# Altium schematic symbol library lib_datalogger.SchLib: 1246 symbols (part 1 of 16)
Pins are listed as number, name and electrical type; pins without a type are passive.

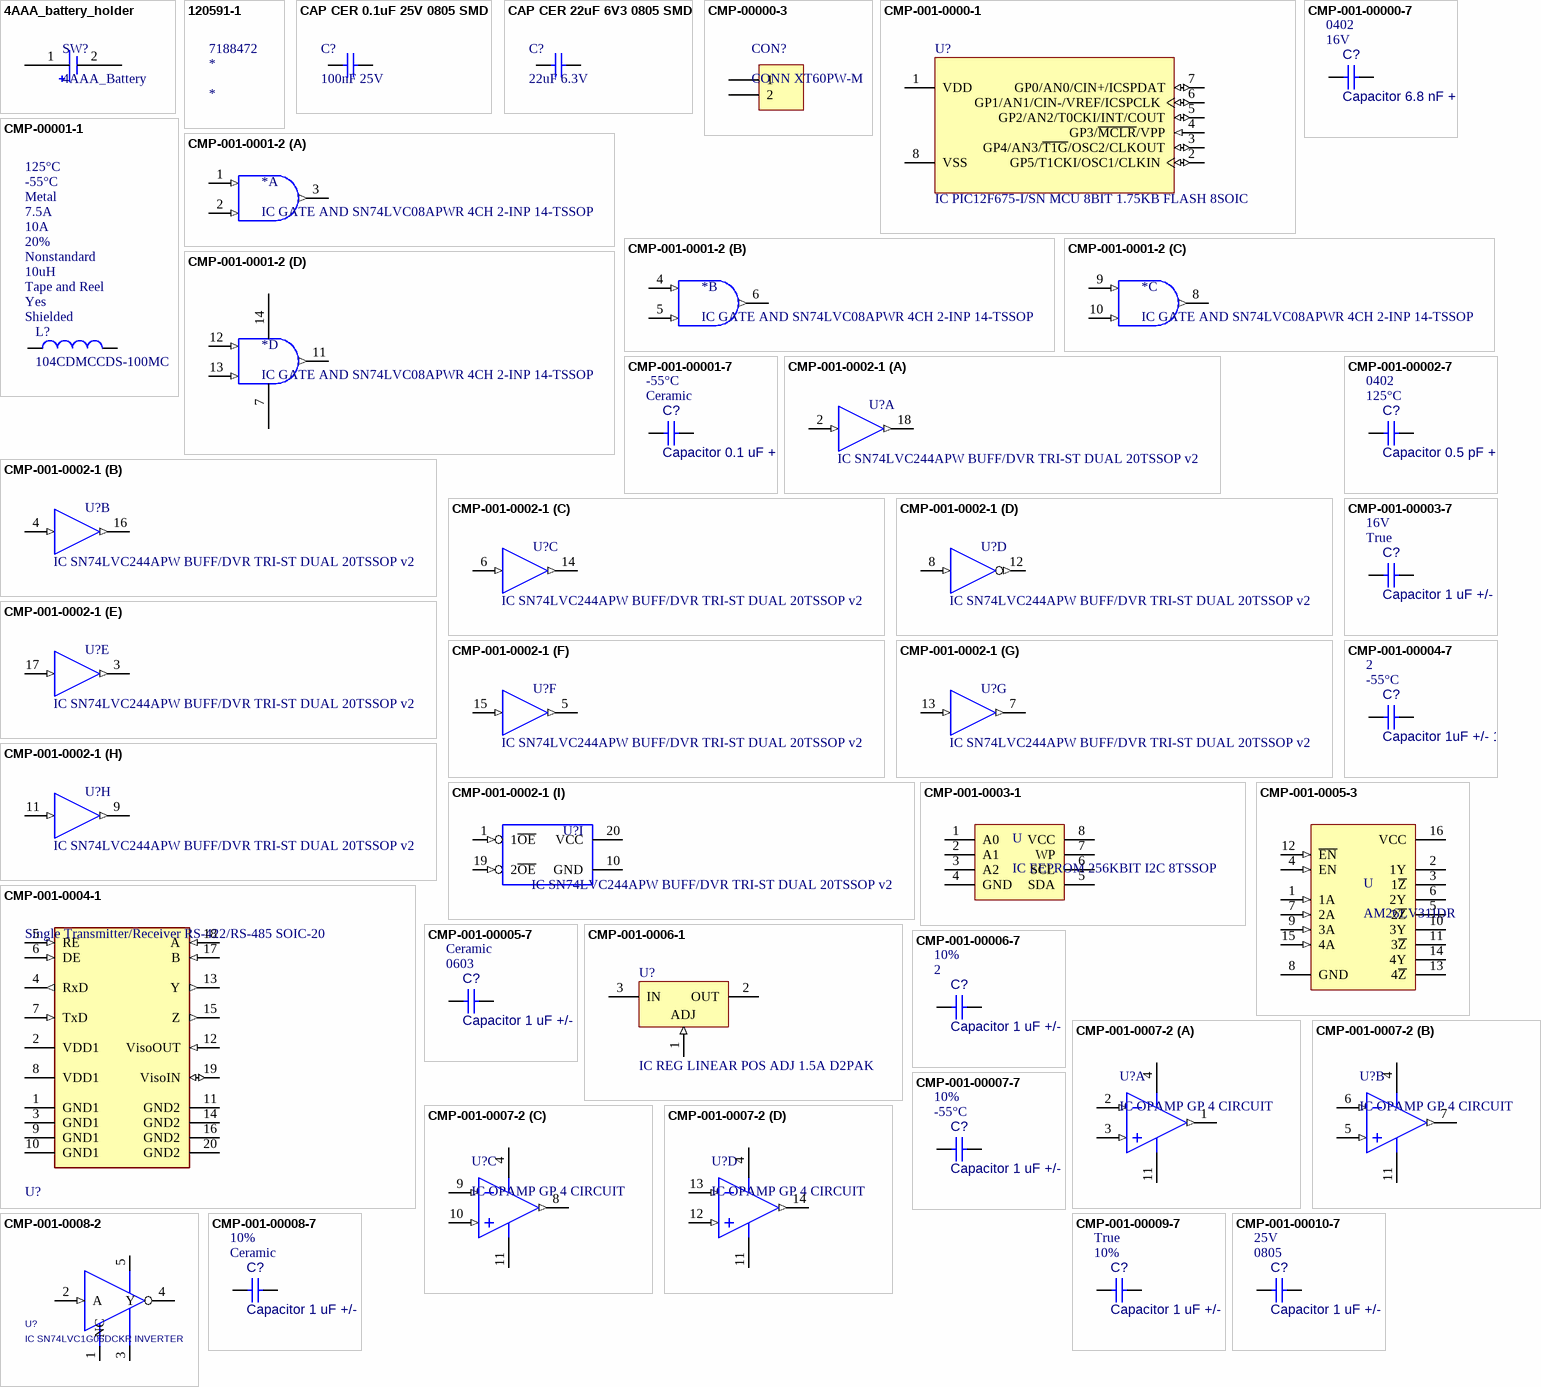
[diagram p0: symbols 4AAA_battery_holder to CMP-001-00010-7]

## 4AAA_battery_holder
designator SW?, comment 4AAA_Battery
Enclosure; Accessory; Battery Holder; Polypropylene; 26ga. 6in Leads; 4-AA; Manufacturer: Bud Industries; Manufacturer Part Number: HH-3633; Number of Cells: 4; Supplier 1: Newark; RoHS: Yes; Category: Batteries and Accessories; Stock 1: 555; Pricing 1: 1=3,20000, 10=3,07000, 25=2,94000, 50=2,80000, 100=2,67000, 250=2,40000 (USD); Mount: Chassis; Material: PP,Polypropylene; Body Material: Polypropylene; Weight: 0.43oz; Color: Black; Package Quantity: 1; Termination: Wire Leads; Number of Batteries: 4; REACH SVHC: Unknown; Lead Free: Lead Free; ComponentLink1URL: https://datasheet.ciiva.com/4628/hb3633-36618-4628665.pdf?src-supplier=Mouser; ComponentLink1Description: https://datasheet.ciiva.com/4628/hb3633-36618-4628665.pdf?src-supplier=Mouser; ComponentLink2URL: https://datasheet.ciiva.com/16495/hb3633-16495410.pdf?src-supplier=Future+Electronics; ComponentLink2Description: https://datasheet.ciiva.com/16495/hb3633-16495410.pdf?src-supplier=Future+Electronics; ComponentLink3URL: https://datasheet.ciiva.com/1438/1807993-1438161.pdf?src-supplier=Newark; ComponentLink3Description: https://datasheet.ciiva.com/1438/1807993-1438161.pdf?src-supplier=Newark; Supplier Part Number 1: 34M2187
footprint 4AAA_BATTERY_HOLDER
pins: 1, 2

## 120591-1
designator *  Supplier Part Number 1: 7188472
Connector Accessories Battery Holder Socket 2 POS Polybutylene Terephthalate Tray; Manufacturer: TE Connectivity; Manufacturer Part Number: 120591-1; Manufacturer Series: 120591; Number of Terminals/Pins: 3; Number of Cells: 1; Max Voltage Rating (AC): 30V; Number of Contacts: 2; PCB Mount Retention: Without; Circuit Application: Signal; Connector System: Board-to-Board; Contact Current Rating: 7A; Gender: Female; Option: General Purpose; Filter Feature: No; Pitch: 2.54mm; Supplier 1: RSComponents; RoHS: Yes; Category: Power Connectors; Stock 1: 1; Pricing 1: 1=2,79700, 25=2,30000, 100=2,16500, 500=1,82900, 1000=1,56000 (USD); Mount: Through Hole,PCB,Board; Number of Pins: 3; Material: Bronze; Contact Plating: Tin; Color: Black; Contact Material: Bronze; Housing Color: Black; Housing Material: PBT; Contact Finish - Mating: TIN; Contact Finish - Termination: TIN; Min Operating Temperature: -30°C; Max Operating Temperature: 70°C; Package Quantity: 144; Packaging: Tray; Termination: Solder; Number of Ports: 1; Orientation: Right Angle; Number of Positions: 2; Voltage Rating: 30V; Contact Gender: Female; Mounting Style: HORIZONTAL; Mixed Contacts: No; Length: 27.3mm; Depth: 19.05mm; Radiation Hardening: No; Lead Free: Lead Free; RoHS Compliant: Yes; ELV: Compliant; Flammability Rating: UL94 V-0; DIN Conformance: No; IEC Conformance: No; MIL Conformance: No; ComponentLink1URL: https://datasheet.ciiva.com/3/eng-cd-120591-h-3795.pdf?src-supplier=Digi-Key; ComponentLink1Description: https://datasheet.ciiva.com/3/eng-cd-120591-h-3795.pdf?src-supplier=Digi-Key; ComponentLink2URL: https://datasheet.ciiva.com/19463/748422-19463210.pdf?src-supplier=Jameco; ComponentLink2Description: https://datasheet.ciiva.com/19463/748422-19463210.pdf?src-supplier=Jameco; ComponentLink3URL: https://datasheet.ciiva.com/1437/1651039-1437553.pdf?src-supplier=Newark; ComponentLink3Description: https://datasheet.ciiva.com/1437/1651039-1437553.pdf?src-supplier=Newark; ComponentLink4URL: https://datasheet.ciiva.com/11746/0900766b80f810d3-11746392.pdf?src-supplier=RSComponents; ComponentLink4Description: https://datasheet.ciiva.com/11746/0900766b80f810d3-11746392.pdf?src-supplier=RSComponents; ComponentLink5URL: https://datasheet.ciiva.com/14643/70087950-14643845.pdf?src-supplier=Allied+Electronics; ComponentLink5Description: https://datasheet.ciiva.com/14643/70087950-14643845.pdf?src-supplier=Allied+Electronics; ComponentLink6URL: https://datasheet.ciiva.com/3126/eng-cs-1773096-sec09-laptops-portables-0210-3126570.pdf?src-supplier=Avnet; ComponentLink6Description: https://datasheet.ciiva.com/3126/eng-cs-1773096-sec09-laptops-portables-0210-3126570.pdf?src-supplier=Avnet

## CAP CER 0.1uF 25V 0805 SMD
designator C?, comment 100nF 25V
Cap Ceramic 0.1uF 25V X7R 10% SMD 0805 125C Plastic T/R; Manufacturer: KEMET; Manufacturer Part Number: C0805C104K3RACTU; Supplier 1: RSComponents; RoHS: Yes; Category: Ceramic Capacitors; Stock 1: 1910; Pricing 1: 10=0,13300, 100=0,12200, 250=0,11000, 500=0,09400, 1000=0,08300 (USD); Mount: PCB,Surface Mount; Case/Package: 0805; Case Code (Imperial): 0805; Case Code (Metric): 2012; Dielectric Material: Ceramic; Contact Plating: Tin,Matte; Min Operating Temperature: -55°C; Max Operating Temperature: 125°C; Packaging: Tape and Reel; Tolerance: 10%; Capacitance: 100nF; Package Quantity: 4000; Voltage Rating: 25V; Series: C0805C; Voltage Rating (DC): 25V; Dielectric: X7R; Termination: SMD/SMT; Construction: Flat; Voltage: 25V; Length: 2mm; Width: 1.2mm; Height: 0.9mm; Depth: 1.25mm; Lead Pitch: 0.75mm; Radiation Hardening: No; RoHS Compliant: Yes; ComponentLink1URL: https://datasheet.ciiva.com/18193/getdatasheetpartid-385649-18193413.pdf?src-supplier=Verical; ComponentLink1Description: https://datasheet.ciiva.com/18193/getdatasheetpartid-385649-18193413.pdf?src-supplier=Verical; ComponentLink2URL: https://datasheet.ciiva.com/7842/kem-c1002-x7r-smd-7842536.pdf?src-supplier=Element14; ComponentLink2Description: https://datasheet.ciiva.com/7842/kem-c1002-x7r-smd-7842536.pdf?src-supplier=Element14; ComponentLink3URL: https://datasheet.ciiva.com/7842/kem-c1002-x7r-smd-7842538.pdf?src-supplier=Element14; ComponentLink3Description: https://datasheet.ciiva.com/7842/kem-c1002-x7r-smd-7842538.pdf?src-supplier=Element14; Supplier Part Number 1: 6480979
footprint CC2012-0805 (Chip Capacitor)
pins: 1, 2

## CAP CER 22uF 6V3 0805 SMD
designator C?, comment 22uF 6.3V
CAP CER 22UF 6.3V X5R 0805; Manufacturer: Samsung; Manufacturer Part Number: CL21A226KQQNNNE; Tolerance: 10%; Supplier 1: Avnet; RoHS: Yes; Category: Ceramic Capacitors; Stock 1: 46000; Pricing 1: 2000=0,02660, 4000=0,02622, 8000=0,02546, 12000=0,02489, 16000=0,02394 (USD); Mount: Surface Mount; Case/Package: 0805; Case Code (Metric): 2012; Case Code (Imperial): 0805; Min Operating Temperature: -55°C; Max Operating Temperature: 85°C; Package Quantity: 1; Packaging: Tape and Reel; Capacitance: 22uF; Voltage Rating: 6.3V; Voltage Rating (DC): 6.3V; Dielectric: X5R; Series: CL; Length: 0.079inch; Width: 0.049inch; Thickness: 0.055inch; Depth: 1.25mm; Radiation Hardening: No; RoHS Compliant: Yes; Lead Free: Lead Free; ComponentLink1URL: https://datasheet.ciiva.com/25796/cl21a226kqqnnne-25796131.pdf?src-supplier=Digi-Key; ComponentLink1Description: https://datasheet.ciiva.com/25796/cl21a226kqqnnne-25796131.pdf?src-supplier=Digi-Key; ComponentLink2URL: https://datasheet.ciiva.com/26838/getdatasheetpartid-353272-26838608.pdf?src-supplier=Verical; ComponentLink2Description: https://datasheet.ciiva.com/26838/getdatasheetpartid-353272-26838608.pdf?src-supplier=Verical; Supplier Part Number 1: CL21A226KQQNNNE
footprint CC2012-0805 (Chip Capacitor)
pins: 1, 2

## CMP-00000-3
designator CON?, comment CONN XT60PW-M
XT60PW Male, yellow; Manufacturer 1: AMASS; Voltage: 500V; current: 30A; Supplier 1: Eletronic Components; Supplier Part Number 1: XT60PW-M; Manufacturer Part Number 1: XT60PW-M; Supplier Unit Price 1: 0,90
footprint CONN XT30PW-M-Footprint-1
pins: 1, 2

## CMP-001-0000-1
designator U?, comment IC PIC12F675-I/SN MCU 8BIT 1.75KB FLASH 8SOIC
MCU 8-bit PIC RISC 1.75KB Flash 2.5V/3.3V/5V Automotive 8-Pin SOIC N Tube; Max Power Dissipation: 800mW; Number of A/D Converters: 1; Number of ADC Channels: 4; Number of I/Os: 6; Oscillator Type: Internal; Min Supply Voltage: 2V; Watchdog Timer: Yes; Access Time: 20us; Interface: RS-232,USB; Address Bus Width: 8b; Supply Current: 100uA; Max Frequency: 20MHz; RAM Size: 64B; Number of Bits: 8; Number of Timers/Counters: 2; Peripherals: POR,WDT; Max Supply Voltage: 5.5V; Lead Free: Lead Free; Packaging: Rail/Tube; Core Architecture: PIC; Mount: Surface Mount; Min Operating Temperature: -40°C; Max Operating Temperature: 85°C; Density: 1.75KB; Memory Size: 1.75KB; Package Quantity: 100; Length: 4.9mm; Number of Pins: 8; Manufacturer Part Number: PIC12F675-I/SN; Radiation Hardening: No; Case/Package: SOIC; Height: 1.5mm; REACH SVHC: No SVHC; Data Bus Width: 8b; Memory Type: FLASH; Width: 3.9mm; Number of Programmable I/O: 6; Frequency: 20MHz; RoHS Compliant: Yes; Nominal Supply Current: 100uA
footprint SOIC-8
pins: 1 VDD (power), 2 GP5/T1CKI/OSC1/CLKIN (io), 3 GP4/AN3/~{T1G}/OSC2/CLKOUT (io), 4 GP3/~{MCLR}/VPP (in), 5 GP2/AN2/T0CKI/INT/COUT (io), 6 GP1/AN1/CIN-/VREF/ICSPCLK (io), 7 GP0/AN0/CIN+/ICSPDAT (io), 8 VSS (power)

## CMP-001-00000-7
designator C?, comment Capacitor 6.8 nF +/- 10% 16 V 0402  value 6.8nF  Voltage Rating: 16V  Case/Package: 0402  Pins: 2  Max Operating Temperature: 125°C  Capacitor Type: Ceramic  Mounting Technology: SM  Tolerance: 10%  RoHS Compliant: True  Min Operating Temperature: -55°C
Chip Capacitor, 6.8 nF, +/- 10%, 16 V, 0402 (1005 Metric)
footprint CAPC0603(1608)100_L (Chip Capacitor, Body 1.6x0.8mm, Height 1.0mm, IPC High Density)
footprint CAPC1005X56X25ML10T15 (Chip Capacitor, 2-Leads, Body 1.10x0.60mm, IPC Low Density)
footprint CAPC1005X56X25LL10T15 (Chip Capacitor, 2-Leads, Body 1.10x0.60mm, IPC High Density)
footprint CAPC1005X56X25NL10T15 (Chip Capacitor, 2-Leads, Body 1.10x0.60mm, IPC Medium Density)
pins: 1, 2

## CMP-00001-1
designator L?, comment 104CDMCCDS-100MC  Shielding: Shielded  RoHS Compliant: Yes  Packaging: Tape and Reel  Inductance: 10uH  Case/Package: Nonstandard  Tolerance: 20%  Saturation Current: 10A  Current Rating: 7.5A  Core Material: Metal  Min Operating Temperature: -55°C  Max Operating Temperature: 125°C
Ind Chip Power Metal Compound 10uH 20% 2-Pin SMD T/R; Test Frequency: 100kHz; DC Resistance (DCR): 30mR; Width: 0.394inch; Height - Seated (Max): 0.157inch; Mount: Surface Mount; Length: 0.453inch
footprint 104CDMCCDS100MC
pins: 1, 2

## CMP-001-0001-2
designator *, comment IC GATE AND SN74LVC08APWR 4CH 2-INP 14-TSSOP
IC GATE AND SN74LVC08APWR 4CH 2-INP 14-TSSOP, 1.65-V to 3.6-V AND gates -40 to 125; Max Output Current: 24mA; Number of Circuits: 4; Schmitt Trigger Input: No; Min Supply Voltage: 1.65V; Turn-On Delay Time: 4.1ns; Quiescent Current: 1uA; Number of Inputs: 2; Number of Outputs: 1; High Level Output Current: -24mA; Propagation Delay: 3.9ns; Max Supply Voltage: 3.6V; Manufacturer Part Number: SN74LVC08APWR; Height: 1.15mm; Radiation Hardening: No; Low Level Output Current: 24mA; Output Current: 24mA; Case/Package: TSSOP; Max Operating Temperature: 125°C; Length: 5mm; Termination: SMD/SMT; Min Operating Temperature: -40°C; REACH SVHC: No SVHC; Number of Gates: 4; Number of Elements: 4; Weight: 0.002018oz; Number of Pins: 14; Logic Function: AND GATE; Packaging: Tape and Reel; Mount: Surface Mount; Lead Free: Lead Free; RoHS Compliant: Yes; Number of Input Lines: 2; Number of Output Lines: 1; Package Quantity: 1; Width: 4.4mm; Number of Bits: 4
footprint MCHP-TSSOP-ST14_V (TSSOP, 14-Leads, Body 5.1x4.5mm, Pitch 0.65mm)
part A pins: 1 A (in), 2 B (in), 3 Y (out)
part B pins: 4 A (in), 5 B (in), 6 Y (out)
part C pins: 8 Y (out), 9 A (in), 10 B (in)
part D pins: 7 GND, 11 Y (out), 12 A (in), 13 B (in), 14 VCC

## CMP-001-00001-7
designator C?, comment Capacitor 0.1 uF +/- 5% 16 V 0402  value 100nF  Capacitor Type: Ceramic  Min Operating Temperature: -55°C  RoHS Compliant: True  Max Operating Temperature: 125°C  Voltage Rating: 16V  Pins: 2  Tolerance: 5%  Mounting Technology: SM  Case/Package: 0402
Chip Capacitor, 0.1 uF, +/- 5%, 16 V, 0402 (1005 Metric)
footprint CAPC0603(1608)100_L (Chip Capacitor, Body 1.6x0.8mm, Height 1.0mm, IPC High Density)
footprint CAPC1005X56X25ML10T15 (Chip Capacitor, 2-Leads, Body 1.10x0.60mm, IPC Low Density)
footprint CAPC1005X56X25LL10T15 (Chip Capacitor, 2-Leads, Body 1.10x0.60mm, IPC High Density)
footprint CAPC1005X56X25NL10T15 (Chip Capacitor, 2-Leads, Body 1.10x0.60mm, IPC Medium Density)
pins: 1, 2

## CMP-001-0002-1
designator U?, comment IC SN74LVC244APW BUFF/DVR TRI-ST DUAL 20TSSOP v2
IC BUFF/DVR TRI-ST DUAL 20TSSOP; Manufacturer Part Number: SN74LVC244APWR; Fornecedor - Sugerido: Digikey; Fabricante - Sugerido: Texas Instruments; Logic Type: Buffer, Non-Inverting; Voltage - Supply: 1.65 V ~ 3.6 V; Current - Output High, Low: 24mA, 24mA; Number of Bits per Element: 4; Number of Elements: 2; Output Type: Push-Pull; PartNumber: SN74LVC244APW; Observação: --; Supplier Device Package: 20-TSSOP; Input Type: -; Operating Temperature: -40°C ~ 125°C (TA); Pricing 1: 1=0.45, 10=0.387, 100=0.289, 500=0.227, 1000=0.175 (USD); ComponentLink1Description: http://www.ti.com/lit/ds/symlink/sn74lvc244a.pdf; Manufacturer: Texas Instruments; Stock 1: 33691; Package / Case: 20-TSSOP (0.173", 4.40mm Width); Category: Integrated Circuits (ICs); Mounting Type: Surface Mount; Part Status: Active; ComponentLink1URL: http://www.ti.com/lit/ds/symlink/sn74lvc244a.pdf; Packaging: Cut Tape (CT); Design Item ID: IC SN74LVC244APW BUFF/DVR TRI-ST DUAL 20TSSOP; Source: mits.SchLib; RoHS: RoHS Compliant
footprint TSSOP20
footprint TSSOP20 - duplicate
footprint 20-TSSOP
part A pins: 2 1A0 (in), 18 1Y0 (out)
part B pins: 4 1A1 (in), 16 1Y1 (out)
part C pins: 6 1A2 (in), 14 1Y2 (out)
part D pins: 8 1A3 (in), 12 1Y3 (out)
part E pins: 3 2Y0 (out), 17 2A0 (in)
part F pins: 5 2Y1 (out), 15 2A1 (in)
part G pins: 7 2Y2 (out), 13 2A2 (in)
part H pins: 9 2Y3 (out), 11 2A3 (in)
part I pins: 1 1~{OE} (in), 10 GND (power), 19 2~{OE} (in), 20 VCC (power)

## CMP-001-00002-7
designator C?, comment Capacitor 0.5 pF +/- 0.1pF 25 V 0402  value 0.5pF  Max Operating Temperature: 125°C  Case/Package: 0402  Mounting Technology: SM  Pins: 2  Min Operating Temperature: -55°C  RoHS Compliant: True  Voltage Rating: 25V  Tolerance: 20%  Capacitor Type: Ceramic
Chip Capacitor, 0.5 pF, +/- 0.1pF, 25 V, 0402 (1005 Metric)
footprint CAPC0603(1608)100_L (Chip Capacitor, Body 1.6x0.8mm, Height 1.0mm, IPC High Density)
footprint CAPC1005X56X25ML10T15 (Chip Capacitor, 2-Leads, Body 1.10x0.60mm, IPC Low Density)
footprint CAPC1005X56X25LL10T15 (Chip Capacitor, 2-Leads, Body 1.10x0.60mm, IPC High Density)
footprint CAPC1005X56X25NL10T15 (Chip Capacitor, 2-Leads, Body 1.10x0.60mm, IPC Medium Density)
pins: 1, 2

## CMP-001-0003-1
designator U, comment IC EEPROM 256KBIT I2C 8TSSOP
EEPROM Memory IC 256Kb (32K x 8) I²C 8-TSSOP; Manufacturer Part Number: 24LC256-I/ST; Min Supply Voltage: 2.5V; Programming Voltage: 5.5V; Interface: I2C,Serial,2-Wire; Write Cycle Time-Max (tWC): 5ms; Organization: 32KX8; Write Protection: YES; Supply Current: 3mA; Access Time-Max: 900ns; Frequency: 400kHz; Case/Package: TSSOP; Package Quantity: 100; Contact Plating: Tin,Matte; Radiation Hardening: No; Lead Free: Lead Free; Mount: Surface Mount; Number of Pins: 8; Length: 3.1mm; Max Operating Temperature: 85°C; Memory Size: 256Kb; Supply Voltage-Nom: 5.5V; Height: 1.05mm; Width: 4.5mm; Memory Type: EEPROM; REACH SVHC: No SVHC; Nominal Supply Current: 3mA; Packaging: Rail/Tube; Min Operating Temperature: -40°C; Density: 256Kb; Max Frequency: 400kHz; RoHS Compliant: Yes; Access Time: 900ns; Max Supply Voltage: 5.5V
footprint TSSOP8
pins: 1 A0 "DEVICE ADDRES 0", 2 A1 "DEVICE ADDRES 1", 3 A2 "DEVICE ADDRES 2", 4 GND "GROUND", 5 SDA "I2C DATA", 6 SCL "I2C DATA CLOCK", 7 WP "WRITE PROTECTION", 8 VCC "3.3V VOLTAGE SUPLY"

## CMP-001-00003-7
designator C?, comment Capacitor 1 uF +/- 10% 16 V 0603  value 1µF  RoHS Compliant: True  Voltage Rating: 16V  Min Operating Temperature: -55°C  Max Operating Temperature: 125°C  Mounting Technology: SM  Capacitor Type: Ceramic  Pins: 2  Tolerance: 10%  Case/Package: 0603
Chip Capacitor, 1 uF, +/- 10%, 16 V, 0603 (1608 Metric)
footprint CAPC0603(1608)100_L (Chip Capacitor, Body 1.6x0.8mm, Height 1.0mm, IPC High Density)
footprint CAPC1608X94X35NL15T15 (Chip Capacitor, 2-Leads, Body 1.75x0.96mm, IPC Medium Density)
footprint CAPC1608X94X35LL15T15 (Chip Capacitor, 2-Leads, Body 1.75x0.96mm, IPC High Density)
footprint CAPC1608X94X35ML15T15 (Chip Capacitor, 2-Leads, Body 1.75x0.96mm, IPC Low Density)
pins: 1, 2

## CMP-001-0004-1
designator U?, comment Single Transmitter/Receiver RS-422/RS-485 SOIC-20
Single Transmitter/Receiver RS-422/RS-485 20-Pin SOIC W Tube; Manufacturer Part Number: ADM2582EBRWZ; Operating Supply Voltage: 5V; Number of Channels: 3; Propagation Delay: 100ns; Number of Receivers: 1; Logic Function: Transceiver; Max Supply Voltage: 5.5V; Operating Supply Current: 230mA; Min Supply Voltage: 3V; Channel Type: Unidirectional; Isolation Voltage: 2.5kV; Data Rate: 16Mbps; ESD Protection: Yes; Simplex/Duplex: Full Duplex; Interface: RS-485,RS-422; Frequency: 16MHz; Height: 2.35mm; Width: 7.6mm; Lead Free: Contains Lead; Package Quantity: 37; RoHS Compliant: Yes; Min Operating Temperature: -40°C; Packaging: Rail/Tube; Number of Pins: 20; Number of Drivers: 1; Number of Transmitters: 1; Number of Transceivers: 1; Length: 13mm; REACH SVHC: No SVHC; Mount: Surface Mount; Case/Package: SOIC; Contact Plating: Tin,Matte; Max Operating Temperature: 85°C; Nominal Supply Current: 230mA; Isolated Power: Yes
footprint STM-SOIC-20_M (SOIC, 20-Leads, Body 13x7.6mm, Pitch 1.27mm, IPC Low Density)
pins: 1 GND1 (power), 2 VDD1 (power), 3 GND1 (power), 4 RxD (out), 5 RE (in), 6 DE (in), 7 TxD (in), 8 VDD1 (power), 9 GND1 (power), 10 GND1 (power), 11 GND2 (power), 12 VisoOUT (in), 13 Y (out), 14 GND2 (power), 15 Z (out), 16 GND2 (power), 17 B (in), 18 A (in), 19 VisoIN (io), 20 GND2 (power)

## CMP-001-00004-7
designator C?, comment Capacitor 1uF +/- 10% 16V 0603  value 1µF  Min Operating Temperature: -55°C  Pins: 2  Tolerance: 10%  Mounting Technology: SM  Max Operating Temperature: 125°C  RoHS Compliant: True  Case/Package: 0603  Capacitor Type: Ceramic  Voltage Rating: 16V
Chip Capacitor, 1 uF, +/- 10%, 16 V, 0603 (1608 Metric)
footprint CAPC0603(1608)100_L (Chip Capacitor, Body 1.6x0.8mm, Height 1.0mm, IPC High Density)
footprint CAPC1608X90X35ML15T15 (Chip Capacitor, 2-Leads, Body 1.75x0.95mm, IPC Low Density)
footprint CAPC1608X90X35NL15T15 (Chip Capacitor, 2-Leads, Body 1.75x0.95mm, IPC Medium Density)
footprint CAPC1608X90X35LL15T15 (Chip Capacitor, 2-Leads, Body 1.75x0.95mm, IPC High Density)
pins: 1, 2

## CMP-001-0005-3
designator U, comment AM26LV31IDR
Low-Voltage High-Speed Quadruple Differential Line Driver 16-SOIC -45 to 85; Max Supply Current: 100uA; Interface: RS-422; Data Rate: 10Mbps; Min Supply Voltage: 3V; ESD Protection: No; Operating Supply Current: 17mA; Number of Receivers: 4; Logic Function: Receiver; Operating Supply Voltage: 3.3V; Max Supply Voltage: 3.6V; RoHS Compliant: Yes; Case/Package: SOIC; Lead Free: Lead Free; Max Operating Temperature: 85°C; Weight: 0.004998oz; Nominal Supply Current: 100uA; Supply Current: 100uA; Contact Plating: Gold; REACH SVHC: No SVHC; Number of Transmitters: 4; Radiation Hardening: No; Packaging: Tape and Reel; Package Quantity: 1; Number of Pins: 16; Number of Drivers: 4; Mount: Surface Mount; Min Operating Temperature: -45°C; Manufacturer Part Number: AM26LV31IDR; Series: -
footprint MAXM-S16+5_M (SOIC, 16-Leads, Body 10x4mm, Pitch 1.27mm, IPC Low Density)
pins: 1 1A (in), 2 1Y (hiz), 3 1~{Z} (hiz), 4 EN (in), 5 2~{Z} (hiz), 6 2Y (hiz), 7 2A (in), 8 GND (power), 9 3A (in), 10 3Y (hiz), 11 3~{Z} (hiz), 12 ~{EN} (in), 13 4~{Z} (hiz), 14 4Y (hiz), 15 4A (in), 16 VCC (power)

## CMP-001-00005-7
designator C?, comment Capacitor 1 uF +/- 10% 25 V 0603  value 1µF  Case/Package: 0603  Capacitor Type: Ceramic  Voltage Rating: 25V  RoHS Compliant: True  Min Operating Temperature: -55°C  Tolerance: 10%  Pins: 2  Max Operating Temperature: 125°C  Mounting Technology: SM
Chip Capacitor, 1 uF, +/- 10%, 25 V, 0603 (1608 Metric)
footprint CAPC0603(1608)100_L (Chip Capacitor, Body 1.6x0.8mm, Height 1.0mm, IPC High Density)
footprint CAPC1608X90X40ML10T20 (Chip Capacitor, 2-Leads, Body 1.70x0.90mm, IPC Low Density)
footprint CAPC1608X90X40NL10T20 (Chip Capacitor, 2-Leads, Body 1.70x0.90mm, IPC Medium Density)
footprint CAPC1608X90X40LL10T20 (Chip Capacitor, 2-Leads, Body 1.70x0.90mm, IPC High Density)
pins: 1, 2

## CMP-001-0006-1
designator U?, comment IC REG LINEAR POS ADJ 1.5A D2PAK
Linear Voltage Regulator IC 1.5A 1.2V to 37V D2PAK; Manufacturer Part Number: LM317D2T-TR; Max Input Voltage: 40V; Power Supply Rejection Ratio (PSRR): 80dB; Polarity: Positive; Output Type: Adjustable; Reference Voltage: 1.3V; Min Input Voltage: 3V; Number of Outputs: 1; Max Output Current: 1.5A; Output Current: 1.5A; Number of Pins: 3; Min Operating Temperature: 0°C; REACH SVHC: No SVHC; Max Output Voltage: 37V; Contact Plating: Tin,Matte; Package Quantity: 1; Length: 10.24mm; Mount: Surface Mount; Height: 4.57mm; Weight: 7.1E-05oz; Series: LM317; Radiation Hardening: No; Width: 9.35mm; Output Voltage: 37V; RoHS Compliant: Yes; Min Output Voltage: 1.2V; Lead Free: Lead Free; Max Operating Temperature: 125°C; Case/Package: TO-263; Number of Regulators: 1; Packaging: Tape and Reel
footprint IC REG LINEAR POS ADJ 1.5A D2PAK-Footprint-1
pins: 1 ADJ (in), 2 OUT (power), 3 IN (power)

## CMP-001-00006-7
designator C?, comment Capacitor 1 uF +/- 10% 25 V 1206  value 1µF  Pins: 2  Tolerance: 10%  Max Operating Temperature: 125°C  Case/Package: 1206  Capacitor Type: Ceramic  RoHS Compliant: True  Mounting Technology: SM  Min Operating Temperature: -55°C  Voltage Rating: 25V
Chip Capacitor, 1 uF, +/- 10%, 25 V, 1206 (3216 Metric)
footprint CAPC0603(1608)100_L (Chip Capacitor, Body 1.6x0.8mm, Height 1.0mm, IPC High Density)
footprint CAPC3216X180X20ML20 (Chip Capacitor, 2-Leads, Body 3.40x1.80mm, IPC Low Density)
footprint CAPC3216X180X20NL20 (Chip Capacitor, 2-Leads, Body 3.40x1.80mm, IPC Medium Density)
footprint CAPC3216X180X20LL20 (Chip Capacitor, 2-Leads, Body 3.40x1.80mm, IPC High Density)
pins: 1, 2

## CMP-001-0007-2
designator U?, comment IC OPAMP GP 4 CIRCUIT
IC OPAMP GP 4 CIRCUIT 14SOIC; Manufacturer Part Number: LM324DR2G; Output Current: 40mA; Slew Rate: 0.6V/µs; Number of Elements: 4; Input Bias Current: 250nA; Supply Current: 1.2mA; Operating Supply Current: 1.4mA; Input Offset Voltage (Vos): 7mV; Min Supply Voltage: 3V; Bandwidth: 1MHz; Power Supply Rejection Ratio (PSRR): 65dB; Operating Supply Voltage: 16V; Voltage Gain: 100dB; Dual Supply Voltage: 9V; Max Supply Voltage: 32V; Amplifier Type: GENERAL PURPOSE; Min Dual Supply Voltage: 1.5V; Input Offset Voltage-Max: 3mV; Halogen Free: Halogen Free; Min Operating Temperature: 0°C; Height: 1.5mm; Output Current per Channel: 40mA; REACH SVHC: No SVHC; RoHS Compliant: Yes; Series: -; Case/Package: SOIC; Radiation Hardening: No; Nominal Supply Current: 1.2mA; Lead Free: Lead Free; Number of Circuits: 4; Max Dual Supply Voltage: 16V; Technology: BIPOLAR; Package Quantity: 2500; Number of Channels: 4; Slew Rate-Nom: 0.6V/µs; Common Mode Rejection Ratio: 65dB; Gain Bandwidth Product: 1MHz; Number of Pins: 14; Max Operating Temperature: 70°C; Length: 8.75mm; Packaging: Tape and Reel; Width: 4mm; Number of Amplifiers: 4
footprint 14-SOIC
pins on every part: 4 VCC (power), 11 VEE/GND (power)
part A pins: 1 OUT1 (out), 2 IN1- (in), 3 IN1+ (in)
part B pins: 5 IN2+ (in), 6 IN2- (in), 7 OUT2 (out)
part C pins: 8 OUT3 (out), 9 IN3- (in), 10 IN3+ (in)
part D pins: 12 IN4+ (in), 13 IN4- (in), 14 OUT4 (out)

## CMP-001-00007-7
designator C?, comment Capacitor 1 uF +/- 10% 50 V 0805  value 1µF  Min Operating Temperature: -55°C  Tolerance: 10%  Max Operating Temperature: 125°C  Case/Package: 0805  Voltage Rating: 50V  Mounting Technology: SM  Pins: 2  Capacitor Type: Ceramic  RoHS Compliant: True
Chip Capacitor, 1 uF, +/- 10%, 50 V, 0805 (2012 Metric)
footprint CAPC0603(1608)100_L (Chip Capacitor, Body 1.6x0.8mm, Height 1.0mm, IPC High Density)
footprint CAPC2013X135X45LL10T25 (Chip Capacitor, 2-Leads, Body 2.10x1.35mm, IPC High Density)
footprint CAPC2013X135X45ML10T25 (Chip Capacitor, 2-Leads, Body 2.10x1.35mm, IPC Low Density)
footprint CAPC2013X135X45NL10T25 (Chip Capacitor, 2-Leads, Body 2.10x1.35mm, IPC Medium Density)
pins: 1, 2

## CMP-001-0008-2
designator U?, comment IC SN74LVC1G06DCKR INVERTER
Inverter IC 1 Channel Open Drain SC-70-5; Manufacturer: Texas Instruments; Number of Circuits: 1; Voltage - Supply: 1.65 V ~ 5.5 V; Current - Quiescent (Max): 10µA; Current - Output High, Low: -, 32mA; Logic Level - Low: 0.7 V ~ 0.8 V; Logic Level - High: 1.7 V ~ 2 V; Max Propagation Delay @ V, Max CL: 3ns @ 5V, 50pF; Output Current: 32mA; Max Supply Voltage: 5.5V; Turn-On Delay Time: 3ns; Polarity: Inverting; Quiescent Current: 10uA; Min Supply Voltage: 1.65V; Logic Function: Buffer,Inverter; Propagation Delay: 6.5ns; Supplier 1: Digi-Key; Manufacturer Part Number: SN74LVC1G06DCKR; RoHS: RoHS Compliant; Category: Integrated Circuits (ICs); Stock 1: 22678; Pricing 1: 1=0.42, 10=0.315, 100=0.196, 500=0.134, 1000=0.103 (USD); Packaging: Cut Tape (CT); Logic Type: Inverter; Number of Inputs: 1; Features: Open Drain; Operating Temperature: -40°C ~ 125°C; Mounting Type: Surface Mount; Supplier Device Package: SC-70-5; Package / Case: 5-TSSOP, SC-70-5, SOT-353; ComponentLink1URL: http://www.ti.com/lit/ds/symlink/sn74lvc1g06.pdf; ComponentLink1Description: http://www.ti.com/lit/ds/symlink/sn74lvc1g06.pdf; Supplier Part Number 1: 296-8484-1-ND; Number of Outputs: 1; Number of Bits: 1; Number of Elements: 1; Number of Output Lines: 1; REACH SVHC: No SVHC; Max Operating Temperature: 125°C; Number of Gates: 1; RoHS Compliant: Yes; Lead Free: Lead Free; Number of Input Lines: 1; Length: 2mm; Package Quantity: 3000; Mount: Surface Mount; Number of Pins: 5; Low Level Output Current: 32mA; Radiation Hardening: No; Min Operating Temperature: -40°C; Height: 0.9mm; Number of Channels: 1; High Level Output Current: 32mA; Contact Plating: Gold; Width: 1.25mm; Case/Package: SC; Packaging: Tape and Reel
footprint SC70-5,DCK,SOT-353
footprint SN74LVC1G06DCKR-Footprint-1
pins: 1 NC, 2 A (in), 3 GND (power), 4 Y (oc), 5 VCC (power)

## CMP-001-00008-7
designator C?, comment Capacitor 1 uF +/- 10% 6.3 V 0402  value 1µF  Capacitor Type: Ceramic  Tolerance: 10%  Mounting Technology: SM  Voltage Rating: 6.3V  Case/Package: 0402  RoHS Compliant: True  Max Operating Temperature: 85°C  Min Operating Temperature: -55°C  Pins: 2
Chip Capacitor, 1 uF, +/- 10%, 6.3 V, 0402 (1005 Metric)
footprint CAPC0603(1608)100_L (Chip Capacitor, Body 1.6x0.8mm, Height 1.0mm, IPC High Density)
footprint CAPC1005X55X25NL05T10 (Chip Capacitor, 2-Leads, Body 1.05x0.55mm, IPC Medium Density)
footprint CAPC1005X55X25LL05T10 (Chip Capacitor, 2-Leads, Body 1.05x0.55mm, IPC High Density)
footprint CAPC1005X55X25ML05T10 (Chip Capacitor, 2-Leads, Body 1.05x0.55mm, IPC Low Density)
pins: 1, 2

## CMP-001-00009-7
designator C?, comment Capacitor 1 uF +/- 10% 6.3 V 1005  value 1µF  Tolerance: 10%  RoHS Compliant: True  Min Operating Temperature: -55°C  Pins: 2  Voltage Rating: 6.3V  Capacitor Type: Ceramic  Mounting Technology: SM  Max Operating Temperature: 85°C  Case/Package: 0402
Chip Capacitor, 1 uF, +/- 10%, 6.3 V, 1005 (0402 Metric)
footprint CAPC0603(1608)100_L (Chip Capacitor, Body 1.6x0.8mm, Height 1.0mm, IPC High Density)
footprint CAPC1005X55X25NL5T10 (Chip Capacitor, 2-Leads, Body 1.05x0.55mm, IPC Medium Density)
footprint CAPC1005X55X25ML5T10 (Chip Capacitor, 2-Leads, Body 1.05x0.55mm, IPC Low Density)
footprint CAPC1005X55X25LL5T10 (Chip Capacitor, 2-Leads, Body 1.05x0.55mm, IPC High Density)
pins: 1, 2

## CMP-001-00010-7
designator C?, comment Capacitor 1 uF +/- 10% 25 V 0805  value 1µF  Case/Package: 0805  Voltage Rating: 25V  Min Operating Temperature: -55°C  Capacitor Type: Ceramic  Tolerance: 10%  RoHS Compliant: True  Pins: 2  Mounting Technology: SM  Max Operating Temperature: 125°C
Chip Capacitor, 1 uF, +/-10%, 25 V, 0805 (2012 Metric)
footprint CAPC0603(1608)100_L (Chip Capacitor, Body 1.6x0.8mm, Height 1.0mm, IPC High Density)
footprint CAPC2013X145X50ML20T25 (Chip Capacitor, 2-Leads, Body 2.2x1.45mm, IPC Low Density)
footprint CAPC2013X145X50NL20T25 (Chip Capacitor, 2-Leads, Body 2.2x1.45mm, IPC Medium Density)
footprint CAPC2013X145X50LL20T25 (Chip Capacitor, 2-Leads, Body 2.2x1.45mm, IPC High Density)
pins: 1, 2

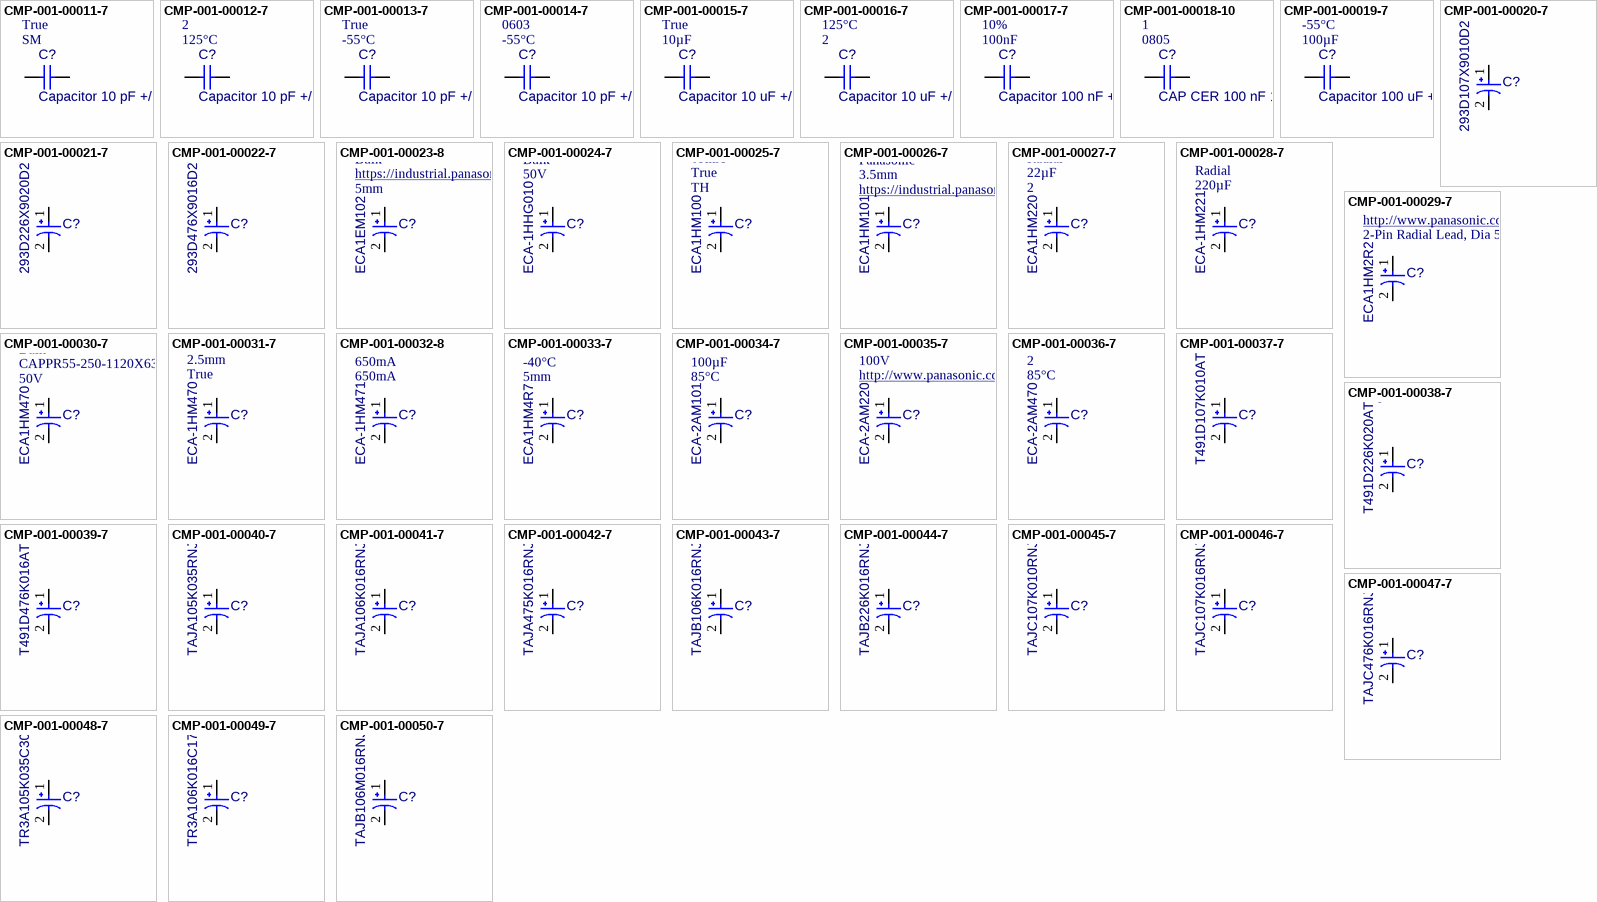
[diagram p1: symbols CMP-001-00011-7 to CMP-001-00050-7]

## CMP-001-00011-7
designator C?, comment Capacitor 10 pF +/- 0.25 pF 50 V 0402  value 10pF  Mounting Technology: SM  RoHS Compliant: True  Case/Package: 0402  Voltage Rating: 50V  Capacitor Type: Ceramic  Min Operating Temperature: -55°C  Tolerance: 0.25%  Pins: 2  Max Operating Temperature: 125°C
Chip Capacitor, 10 pF, +/- 0.25 pF, 50 V, 0402 (1005 Metric)
footprint CAPC0603(1608)100_L (Chip Capacitor, Body 1.6x0.8mm, Height 1.0mm, IPC High Density)
footprint CAPC1005X55X30NL05T10 (Chip Capacitor, 2-Leads, Body 1.05x0.55mm, IPC Medium Density)
footprint CAPC1005X55X30ML05T10 (Chip Capacitor, 2-Leads, Body 1.05x0.55mm, IPC Low Density)
footprint CAPC1005X55X30LL05T10 (Chip Capacitor, 2-Leads, Body 1.05x0.55mm, IPC High Density)
pins: 1, 2

## CMP-001-00012-7
designator C?, comment Capacitor 10 pF +/- 0.25 pF 50 V 0603  value 10pF  Max Operating Temperature: 125°C  Pins: 2  Min Operating Temperature: -55°C  Case/Package: 0603  Capacitor Type: Ceramic  Tolerance: 0.25%  RoHS Compliant: True  Voltage Rating: 50V  Mounting Technology: SM
Chip Capacitor, 10 pF, +/- 0.25 pF, 50 V, 0603 (1608 Metric)
footprint CAPC0603(1608)100_L (Chip Capacitor, Body 1.6x0.8mm, Height 1.0mm, IPC High Density)
footprint CAPC1608X87X35NL15T15 (Chip Capacitor, 2-Leads, Body 1.75x0.95mm, IPC Medium Density)
footprint CAPC1608X87X35ML15T15 (Chip Capacitor, 2-Leads, Body 1.75x0.95mm, IPC Low Density)
footprint CAPC1608X87X35LL15T15 (Chip Capacitor, 2-Leads, Body 1.75x0.95mm, IPC High Density)
pins: 1, 2

## CMP-001-00013-7
designator C?, comment Capacitor 10 pF +/- 5% 50 V 0402  value 10pF  Min Operating Temperature: -55°C  RoHS Compliant: True  Pins: 2  Voltage Rating: 50V  Capacitor Type: Ceramic  Tolerance: 5%  Mounting Technology: SM  Case/Package: 0402  Max Operating Temperature: 125°C
Chip Capacitor, 10 pF, +/- 5%, 50 V, 0402 (1005 Metric)
footprint CAPC0603(1608)100_L (Chip Capacitor, Body 1.6x0.8mm, Height 1.0mm, IPC High Density)
footprint CAPC1005X55X25LL05T05 (Chip Capacitor, 2-Leads, Body 1.05x0.55mm, IPC High Density)
footprint CAPC1005X55X25ML05T05 (Chip Capacitor, 2-Leads, Body 1.05x0.55mm, IPC Low Density)
footprint CAPC1005X55X25NL05T05 (Chip Capacitor, 2-Leads, Body 1.05x0.55mm, IPC Medium Density)
pins: 1, 2

## CMP-001-00014-7
designator C?, comment Capacitor 10 pF +/- 5% 50 V 0603  value 10pF  Min Operating Temperature: -55°C  Case/Package: 0603  Tolerance: 5%  Max Operating Temperature: 125°C  Mounting Technology: SM  Pins: 2  Voltage Rating: 50V  Capacitor Type: Ceramic  RoHS Compliant: True
Chip Capacitor, 10 pF, +/- 5%, 50 V, 0603 (1608 Metric)
footprint CAPC0603(1608)100_L (Chip Capacitor, Body 1.6x0.8mm, Height 1.0mm, IPC High Density)
footprint CAPC1608X90X40ML10T20 (Chip Capacitor, 2-Leads, Body 1.70x0.90mm, IPC Low Density)
footprint CAPC1608X90X40NL10T20 (Chip Capacitor, 2-Leads, Body 1.70x0.90mm, IPC Medium Density)
footprint CAPC1608X90X40LL10T20 (Chip Capacitor, 2-Leads, Body 1.70x0.90mm, IPC High Density)
pins: 1, 2

## CMP-001-00015-7
designator C?, comment Capacitor 10 uF +/- 10% 16 V 0805  value 10µF  RoHS Compliant: True  Pins: 2  Mounting Technology: SM  Voltage Rating: 16V  Tolerance: 10%  Capacitor Type: Ceramic  Case/Package: 0805  Min Operating Temperature: -55°C  Max Operating Temperature: 85°C
Chip Capacitor, 10 uF, +/- 10%, 16 V, 0805 (2012 Metric)
footprint CAPC0603(1608)100_L (Chip Capacitor, Body 1.6x0.8mm, Height 1.0mm, IPC High Density)
footprint CAPC2013X135X45LL10T25 (Chip Capacitor, 2-Leads, Body 2.10x1.35mm, IPC High Density)
footprint CAPC2013X135X45ML10T25 (Chip Capacitor, 2-Leads, Body 2.10x1.35mm, IPC Low Density)
footprint CAPC2013X135X45NL10T25 (Chip Capacitor, 2-Leads, Body 2.10x1.35mm, IPC Medium Density)
pins: 1, 2

## CMP-001-00016-7
designator C?, comment Capacitor 10 uF +/- 10% 16 V 1206  value 10µF  Pins: 2  Max Operating Temperature: 125°C  Capacitor Type: Ceramic  Min Operating Temperature: -55°C  Mounting Technology: SM  Case/Package: 1206  RoHS Compliant: True  Voltage Rating: 16V  Tolerance: 10%
Chip Capacitor, 10 uF, +/- 10%, 16 V, 1206 (3216 Metric)
footprint CAPC0603(1608)100_L (Chip Capacitor, Body 1.6x0.8mm, Height 1.0mm, IPC High Density)
footprint CAPC3216X180X50ML20T25 (Chip Capacitor, 2-Leads, Body 3.40x1.80mm, IPC Low Density)
footprint CAPC3216X180X50NL20T25 (Chip Capacitor, 2-Leads, Body 3.40x1.80mm, IPC Medium Density)
footprint CAPC3216X180X50LL20T25 (Chip Capacitor, 2-Leads, Body 3.40x1.80mm, IPC High Density)
pins: 1, 2

## CMP-001-00017-7
designator C?, comment Capacitor 100 nF +/-10% 50 V 0603  value 100nF  Tolerance: 10%  Max Operating Temperature: 125°C  Capacitor Type: Ceramic  Mounting Technology: SM  Pins: 2  Voltage Rating: 50V  Min Operating Temperature: -55°C  Case/Package: 0603  RoHS Compliant: True
Chip Capacitor, 100 nF, +/- 10%, 50 V, 0603 (1608 Metric)
footprint CAPC0603(1608)100_L (Chip Capacitor, Body 1.6x0.8mm, Height 1.0mm, IPC High Density)
footprint CAPC1608X90X40ML10T20 (Chip Capacitor, 2-Leads, Body 1.70x0.90mm, IPC Low Density)
footprint CAPC1608X90X40NL10T20 (Chip Capacitor, 2-Leads, Body 1.70x0.90mm, IPC Medium Density)
footprint CAPC1608X90X40LL10T20 (Chip Capacitor, 2-Leads, Body 1.70x0.90mm, IPC High Density)
pins: 1, 2

## CMP-001-00018-10
designator C?, comment CAP CER 100 nF 10% 50 V 0805 SMD  value 100nF  Case/Package: 0805  Package Quantity: 1  Mounting Technology: SM  Packaging: Tape and Reel  Tolerance: 10%  Min Operating Temperature: -55°C  Voltage Rating: 50V  Capacitor Type: Ceramic  RoHS Compliant: Yes  Pins: 2  Max Operating Temperature: 125°C